# Altium footprint library OneBoxLib_OTHER.PcbLib: 64 footprints (part 2 of 4)
Each footprint in its own frame and in the unit in brackets; x right, y up, seen from the top. Pads: shape width x height; smd on the part's side, far side on the other; paste and mask are expansions set on the pad; w line width, h text height; cw(c..) or ccw(c..) is an arc to the next point about the centre after c.
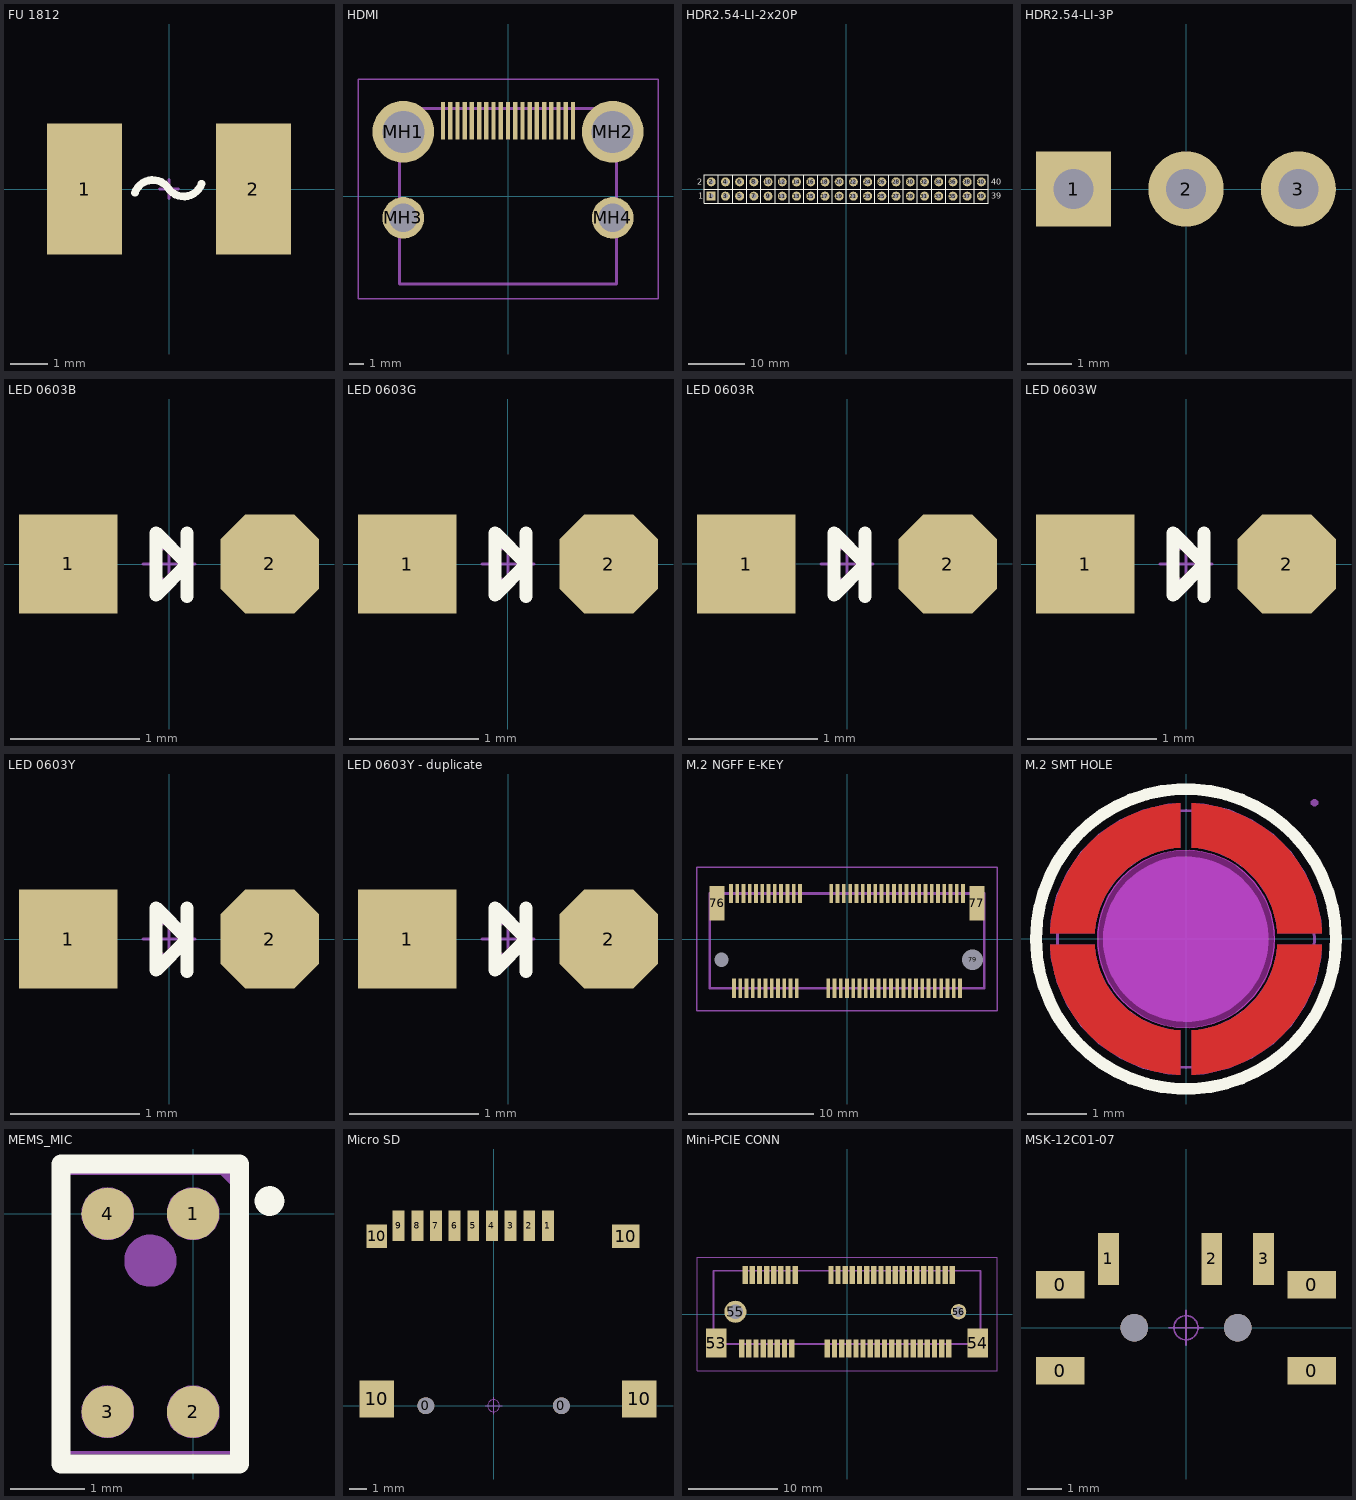
[diagram p1: the footprints below, top view; thin cyan lines are the x and y axes]

## FU 1812 [mm] "贴片保险丝"
pads (2):
  rect 2x3.5 smd: 1(-2.25,0) 2(2.25,0)
Top Overlay:
  lines w0.203: -0.908,-0.1 cw(c-0.434,-0.26) -0.02,0.02 ccw(c0.394,0.3) 0.868,0.14
Mechanical 15:
  lines w0.076: -0.254,0 0.254,0 ; 0,-0.254 0,0.254
3D body "FU 01812.STEP": height 0.87, standoff 0, extent -2.3,-1.61 2.3,1.61

## HDMI [mm]
pads (23):
  rect 0.3x2.6 smd: 1(4.5,5.235) 2(4,5.235) 3(3.5,5.235) 4(3,5.235) 5(2.5,5.235) 6(2,5.235) 7(1.5,5.235) 8(1,5.235) 9(0.5,5.235) 10(0,5.235) 11(-0.5,5.235) 12(-1,5.235) 13(-1.5,5.235) 14(-2,5.235) 15(-2.5,5.235) 16(-3,5.235) 17(-3.5,5.235) 18(-4,5.235) 19(-4.5,5.235)
  round 4.275 hole 2.909: MH1(-7.25,4.475) MH2(7.25,4.475)
  round 2.88 hole 1.992: MH3(-7.25,-1.485) MH4(7.25,-1.485)
Mechanical 13:
  lines w0.2: -7.5,-6.075 7.5,-6.075 7.5,6.075 -7.5,6.075 -7.5,-6.075
Mechanical 15:
  lines w0.1: -10.387,-7.075 10.387,-7.075 10.387,8.1 -10.387,8.1 -10.387,-7.075
3D body "208658-1051.stp": height 6.18, standoff -2.21, extent -7.499,-5.99 7.501,6.16

## HDR2.54-LI-2x20P [mm] "双排排针，20x2脚"
pads (40):
  rect 1.6x1.6 hole 0.9: 1(-24.13,-1.27)
  round 1.6 hole 0.9: 2(-24.13,1.27) 3(-21.59,-1.27) 4(-21.59,1.27) 5(-19.05,-1.27) 6(-19.05,1.27) 7(-16.51,-1.27) 8(-16.51,1.27) 9(-13.97,-1.27) 10(-13.97,1.27) 11(-11.43,-1.27) 12(-11.43,1.27) 13(-8.89,-1.27) 14(-8.89,1.27) 15(-6.35,-1.27) 16(-6.35,1.27) 17(-3.81,-1.27) 18(-3.81,1.27) 19(-1.27,-1.27) 20(-1.27,1.27) 21(1.27,-1.27) 22(1.27,1.27) 23(3.81,-1.27) 24(3.81,1.27) 25(6.35,-1.27) 26(6.35,1.27) 27(8.89,-1.27) 28(8.89,1.27) 29(11.43,-1.27) 30(11.43,1.27) 31(13.97,-1.27) 32(13.97,1.27) 33(16.51,-1.27) 34(16.51,1.27) 35(19.05,-1.27) 36(19.05,1.27) 37(21.59,-1.27) 38(21.59,1.27) 39(24.13,-1.27) 40(24.13,1.27)
Top Overlay:
  lines w0.2: 25.4,-2.54 -25.4,-2.54 -25.4,2.54 25.4,2.54
  lines w0.203: -25.4,0 25.4,0 ; -22.86,-2.54 -22.86,2.54 ; -20.32,-2.54 -20.32,2.54 ; -17.78,-2.54 -17.78,2.54 ; -15.24,-2.54 -15.24,2.54 ; -12.7,-2.54 -12.7,2.54 ; -10.16,-2.54 -10.16,2.54 ; -7.62,-2.54 -7.62,2.54 ; -5.08,-2.54 -5.08,2.54 ; -2.54,-2.54 -2.54,2.54 ; 0,-2.54 0,2.54 ; 2.54,-2.54 2.54,2.54 ; 5.08,-2.54 5.08,2.54 ; 7.62,-2.54 7.62,2.54 ; 10.16,-2.54 10.16,2.54 ; 12.7,-2.54 12.7,2.54 ; 15.24,-2.54 15.24,2.54 ; 17.78,-2.54 17.78,2.54 ; 20.32,-2.54 20.32,2.54 ; 22.86,-2.54 22.86,2.54 ; 25.4,-2.54 25.4,2.54
  text "39" at 25.908,-1.778 h1.02
  text "40" at 25.908,0.762 h1.02
  text "2" at -26.67,0.762 h1.02
  text "1" at -26.416,-1.778 h1.02
3D body "HDR2.54-1x2P.STEP": height 8.5, standoff -3, extent -15.24,-2.54 -12.7,2.54
3D body "HDR2.54-1x2P.STEP": height 8.5, standoff -3, extent -22.86,-2.54 -20.32,2.54
3D body "HDR2.54-1x2P.STEP": height 8.5, standoff -3, extent -25.4,-2.54 -22.86,2.54
3D body "HDR2.54-1x2P.STEP": height 8.5, standoff -3, extent -17.78,-2.54 -15.24,2.54
3D body "HDR2.54-1x2P.STEP": height 8.5, standoff -3, extent -20.32,-2.54 -17.78,2.54
3D body "HDR2.54-1x2P.STEP": height 8.5, standoff -3, extent -2.54,-2.54 0,2.54
3D body "HDR2.54-1x2P.STEP": height 8.5, standoff -3, extent -10.16,-2.54 -7.62,2.54
3D body "HDR2.54-1x2P.STEP": height 8.5, standoff -3, extent -12.7,-2.54 -10.16,2.54
3D body "HDR2.54-1x2P.STEP": height 8.5, standoff -3, extent -5.08,-2.54 -2.54,2.54
3D body "HDR2.54-1x2P.STEP": height 8.5, standoff -3, extent -7.62,-2.54 -5.08,2.54
3D body "HDR2.54-1x2P.STEP": height 8.5, standoff -3, extent 10.16,-2.54 12.7,2.54
3D body "HDR2.54-1x2P.STEP": height 8.5, standoff -3, extent 2.54,-2.54 5.08,2.54
3D body "HDR2.54-1x2P.STEP": height 8.5, standoff -3, extent 0,-2.54 2.54,2.54
3D body "HDR2.54-1x2P.STEP": height 8.5, standoff -3, extent 7.62,-2.54 10.16,2.54
3D body "HDR2.54-1x2P.STEP": height 8.5, standoff -3, extent 5.08,-2.54 7.62,2.54
3D body "HDR2.54-1x2P.STEP": height 8.5, standoff -3, extent 22.86,-2.54 25.4,2.54
3D body "HDR2.54-1x2P.STEP": height 8.5, standoff -3, extent 15.24,-2.54 17.78,2.54
3D body "HDR2.54-1x2P.STEP": height 8.5, standoff -3, extent 12.7,-2.54 15.24,2.54
3D body "HDR2.54-1x2P.STEP": height 8.5, standoff -3, extent 20.32,-2.54 22.86,2.54
3D body "HDR2.54-1x2P.STEP": height 8.5, standoff -3, extent 17.78,-2.54 20.32,2.54

## HDR2.54-LI-3P [mm] "排针，3脚"
pads (3):
  rect 1.7x1.7 hole 0.9: 1(-2.54,0)
  round 1.7 hole 0.9: 2(0,0) 3(2.54,0)
3D body "HDR2.54-1P.STEP": height 8.5, standoff -3, extent -3.81,-1.27 -1.27,1.27
3D body "HDR2.54-1P.STEP": height 8.5, standoff -3, extent -1.27,-1.27 1.27,1.27
3D body "HDR2.54-1P.STEP": height 8.5, standoff -3, extent 1.27,-1.27 3.81,1.27

## LED 0603B [mil] "蓝色0603LED"
pads (2):
  rect 30x30 smd: 1(-30.59,0)
  oct 30x30 smd: 2(30.59,0)
Top Overlay:
  lines w4: 5.51,-9.84 5.51,9.45 ; -3.94,-9.45 5.51,0 -3.94,9.45 -3.94,-9.45
Mechanical 15:
  circle w1: c0,0 r5
  lines w1: -7.87,0 7.87,0 ; 0,-7.87 0,7.88
3D body "LED 0603-B.STEP": height 18.36, standoff -0.16, extent -31.49,-15.78 31.5,15.79
3D body "LED 0603玻璃罩.STEP": height 23.82, standoff 8.07, extent -23.63,-15.75 23.62,15.75

## LED 0603G [mil] "绿色0603LED"
pads (2):
  rect 30x30 smd: 1(-30.59,0)
  oct 30x30 smd: 2(30.59,0)
Top Overlay:
  lines w4: 5.51,-9.84 5.51,9.45 ; -3.94,-9.45 -3.94,9.45 5.51,0 -3.94,-9.45
Mechanical 15:
  circle w1: c0,0 r5
  lines w1: -7.87,0 7.88,0 ; 0,-7.87 0,7.88
3D body "LED 0603玻璃罩.STEP": height 23.82, standoff 8.07, extent -23.62,-15.75 23.62,15.74
3D body "LED 0603-G.STEP": height 18.36, standoff -0.16, extent -31.49,-15.79 31.5,15.79

## LED 0603R [mil] "红色0603LED"
pads (2):
  rect 30x30 smd: 1(-30.59,0)
  oct 30x30 smd: 2(30.59,0)
Top Overlay:
  lines w4: 5.51,-9.85 5.51,9.44 ; -3.94,-9.45 -3.94,9.44 5.51,0 -3.94,-9.45
Mechanical 15:
  circle w1: c0,0 r5
  lines w1: -7.88,0 7.87,0 ; 0,-7.88 0,7.87
3D body "LED 0603玻璃罩.STEP": height 23.82, standoff 8.07, extent -23.63,-15.75 23.62,15.74
3D body "LED 0603-R.STEP": height 18.36, standoff -0.16, extent -31.49,-15.78 31.5,15.79

## LED 0603W [mil] "白色0603LED"
pads (2):
  rect 30x30 smd: 1(-30.59,0)
  oct 30x30 smd: 2(30.59,0)
Top Overlay:
  lines w4: 5.51,-9.84 5.51,9.45 ; -3.94,-9.45 -3.94,9.45 5.51,0 -3.94,-9.45
Mechanical 15:
  circle w1: c0,0 r5
  lines w1: -7.87,0 7.87,0 ; 0,-7.87 0,7.87
3D body "LED 0603-W.STEP": height 18.36, standoff -0.16, extent -31.49,-15.78 31.5,15.8
3D body "LED 0603玻璃罩.STEP": height 23.82, standoff 8.07, extent -23.62,-15.75 23.62,15.75

## LED 0603Y [mil] "黄色0603LED"
pads (2):
  rect 30x30 smd: 1(-30.59,0)
  oct 30x30 smd: 2(30.59,0)
Top Overlay:
  lines w4: 5.51,-9.84 5.51,9.45 ; -3.94,-9.45 -3.94,9.45 5.51,0 -3.94,-9.45
Mechanical 15:
  circle w1: c0,0 r5
  lines w1: -7.87,0 7.87,0 ; 0,-7.87 0,7.87
3D body "LED 0603玻璃罩.STEP": height 23.82, standoff 8.07, extent -23.63,-15.75 23.62,15.74
3D body "LED 0603-Y.STEP": height 18.36, standoff -0.16, extent -31.5,-16.04 31.5,15.54

## LED 0603Y - duplicate [mil] "黄色0603LED"
pads (2):
  rect 30x30 smd: 1(-30.59,0)
  oct 30x30 smd: 2(30.59,0)
Top Overlay:
  lines w4: 5.51,-9.84 5.51,9.45 ; -3.94,-9.45 -3.94,9.45 5.51,0 -3.94,-9.45
Mechanical 15:
  circle w1: c0,0 r5
  lines w1: -7.87,0 7.87,0 ; 0,-7.87 0,7.87
3D body "LED 0603-Y.STEP": height 18.36, standoff -0.16, extent -31.5,-16.04 31.5,15.54
3D body "LED 0603玻璃罩.STEP": height 23.82, standoff 8.07, extent -23.63,-15.75 23.62,15.74

## M.2 NGFF E-KEY [mm]
pads (71):
  rect 0.3x1.55 smd: 1(-9.25,3.625) 2(-9,-3.925) 3(-8.75,3.625) 4(-8.5,-3.925) 5(-8.25,3.625) 6(-8,-3.925) 7(-7.75,3.625) 8(-7.5,-3.925) 9(-7.25,3.625) 10(-7,-3.925) 11(-6.75,3.625) 12(-6.5,-3.925) 13(-6.25,3.625) 14(-6,-3.925) 15(-5.75,3.625) 16(-5.5,-3.925) 17(-5.25,3.625) 18(-5,-3.925) 19(-4.75,3.625) 20(-4.5,-3.925) 21(-4.25,3.625) 22(-4,-3.925) 23(-3.75,3.625) 32(-1.5,-3.925) 33(-1.25,3.625) 34(-1,-3.925) 35(-0.75,3.625) 36(-0.5,-3.925) 37(-0.25,3.625) 38(0,-3.925) 39(0.25,3.625) 40(0.5,-3.925) 41(0.75,3.625) 42(1,-3.925) 43(1.25,3.625) 44(1.5,-3.925) 45(1.75,3.625) 46(2,-3.925) 47(2.25,3.625) 48(2.5,-3.925) 49(2.75,3.625) 50(3,-3.925) 51(3.25,3.625) 52(3.5,-3.925) 53(3.75,3.625) 54(4,-3.925) 55(4.25,3.625) 56(4.5,-3.925) 57(4.75,3.625) 58(5,-3.925) 59(5.25,3.625) 60(5.5,-3.925) 61(5.75,3.625) 62(6,-3.925) 63(6.25,3.625) 64(6.5,-3.925) 65(6.75,3.625) 66(7,-3.925) 67(7.25,3.625) 68(7.5,-3.925) 69(7.75,3.625) 70(8,-3.925) 71(8.25,3.625) 72(8.5,-3.925) 73(8.75,3.625) 74(9,-3.925) 75(9.25,3.625)
  rect 1.2x2.75 smd: 76(-10.35,2.85) 77(10.35,2.85)
  round 0.575 hole 1.15 unplated: 78(-10,-1.65)
  round 0.825 hole 1.65 unplated: 79(10,-1.65)
Mechanical 13:
  lines w0.2: -10.95,-3.925 10.95,-3.925 10.95,3.625 -10.95,3.625 -10.95,-3.925
Mechanical 15:
  lines w0.1: -11.95,-5.7 -11.95,5.7 11.95,5.7 11.95,-5.7 -11.95,-5.7
3D body "2199230-4.stp": height 4.13, standoff -0.58, extent -10.95,-4.5 10.95,4.2

## M.2 SMT HOLE [mm]
Top Layer:
  region: 2.294,-0.099 1.544,-0.099 1.54,-0.157 1.533,-0.214 1.524,-0.27 1.513,-0.327 1.5,-0.383 1.485,-0.438 1.468,-0.493 1.448,-0.547 1.427,-0.6 1.404,-0.653 1.379,-0.705 1.352,-0.755 1.323,-0.805 1.292,-0.854 1.26,-0.901 1.226,-0.947 1.19,-0.992 1.152,-1.036 1.113,-1.078 1.073,-1.118 1.031,-1.158 0.987,-1.195 0.942,-1.231 0.896,-1.265 0.849,-1.298 0.8,-1.328 0.75,-1.357 0.7,-1.384 0.648,-1.409 0.595,-1.432 0.542,-1.453 0.488,-1.473 0.433,-1.49 0.378,-1.505 0.322,-1.518 0.265,-1.529 0.208,-1.538 0.151,-1.545 0.094,-1.549 0.094,-2.299 0.164,-2.295 0.233,-2.289 0.302,-2.281 0.371,-2.271 0.44,-2.258 0.508,-2.244 0.576,-2.227 0.643,-2.208 0.71,-2.188 0.776,-2.165 0.841,-2.141 0.905,-2.114 0.969,-2.085 1.032,-2.055 1.094,-2.023 1.154,-1.988 1.214,-1.952 1.273,-1.915 1.33,-1.875 1.386,-1.834 1.441,-1.791 1.495,-1.746 1.547,-1.7 1.598,-1.652 1.647,-1.603 1.695,-1.552 1.741,-1.5 1.786,-1.446 1.829,-1.391 1.87,-1.335 1.91,-1.278 1.947,-1.219 1.983,-1.159 2.018,-1.099 2.05,-1.037 2.08,-0.974 2.109,-0.911 2.135,-0.846 2.16,-0.781 2.183,-0.715 2.203,-0.648 2.222,-0.581 2.239,-0.513 2.253,-0.445 2.265,-0.377 2.276,-0.308 2.284,-0.238 2.29,-0.169
  region: -2.3,0.094 -1.55,0.094 -1.545,0.151 -1.538,0.208 -1.529,0.265 -1.518,0.321 -1.505,0.377 -1.49,0.432 -1.473,0.487 -1.454,0.542 -1.433,0.595 -1.41,0.647 -1.384,0.699 -1.357,0.75 -1.329,0.8 -1.298,0.848 -1.266,0.896 -1.231,0.942 -1.195,0.987 -1.158,1.03 -1.119,1.072 -1.078,1.113 -1.036,1.152 -0.993,1.189 -0.948,1.225 -0.902,1.259 -0.854,1.292 -0.806,1.323 -0.756,1.351 -0.705,1.378 -0.653,1.404 -0.601,1.427 -0.547,1.448 -0.493,1.467 -0.438,1.484 -0.383,1.499 -0.327,1.512 -0.271,1.523 -0.214,1.532 -0.157,1.539 -0.1,1.544 -0.1,2.294 -0.169,2.29 -0.239,2.284 -0.308,2.275 -0.377,2.265 -0.446,2.253 -0.514,2.238 -0.582,2.222 -0.649,2.203 -0.715,2.182 -0.781,2.16 -0.847,2.135 -0.911,2.108 -0.975,2.08 -1.037,2.049 -1.099,2.017 -1.16,1.983 -1.22,1.947 -1.278,1.909 -1.336,1.87 -1.392,1.828 -1.447,1.785 -1.5,1.741 -1.552,1.694 -1.603,1.647 -1.653,1.597 -1.7,1.546 -1.747,1.494 -1.791,1.441 -1.834,1.386 -1.875,1.33 -1.915,1.272 -1.953,1.214 -1.989,1.154 -2.023,1.093 -2.055,1.031 -2.086,0.969 -2.114,0.905 -2.141,0.841 -2.166,0.775 -2.188,0.709 -2.209,0.643 -2.227,0.576 -2.244,0.508 -2.259,0.44 -2.271,0.371 -2.281,0.302 -2.29,0.233 -2.296,0.163
  region: -0.099,-2.3 -0.099,-1.55 -0.157,-1.545 -0.214,-1.538 -0.27,-1.529 -0.327,-1.518 -0.383,-1.505 -0.438,-1.49 -0.493,-1.473 -0.547,-1.454 -0.601,-1.433 -0.653,-1.41 -0.705,-1.384 -0.755,-1.357 -0.805,-1.329 -0.854,-1.298 -0.901,-1.266 -0.947,-1.231 -0.992,-1.195 -1.036,-1.158 -1.078,-1.119 -1.118,-1.078 -1.158,-1.036 -1.195,-0.993 -1.231,-0.948 -1.265,-0.902 -1.298,-0.854 -1.328,-0.806 -1.357,-0.756 -1.384,-0.705 -1.409,-0.653 -1.432,-0.601 -1.453,-0.548 -1.473,-0.493 -1.49,-0.439 -1.505,-0.383 -1.518,-0.327 -1.529,-0.271 -1.538,-0.214 -1.545,-0.157 -1.549,-0.1 -2.299,-0.1 -2.295,-0.169 -2.289,-0.239 -2.281,-0.308 -2.271,-0.377 -2.258,-0.446 -2.244,-0.514 -2.227,-0.582 -2.209,-0.649 -2.188,-0.715 -2.165,-0.781 -2.141,-0.847 -2.114,-0.911 -2.086,-0.975 -2.055,-1.037 -2.023,-1.099 -1.989,-1.16 -1.953,-1.22 -1.915,-1.278 -1.875,-1.336 -1.834,-1.392 -1.791,-1.447 -1.746,-1.5 -1.7,-1.553 -1.652,-1.603 -1.603,-1.653 -1.552,-1.7 -1.5,-1.747 -1.446,-1.791 -1.391,-1.834 -1.335,-1.876 -1.278,-1.915 -1.219,-1.953 -1.16,-1.989 -1.099,-2.023 -1.037,-2.055 -0.974,-2.086 -0.911,-2.114 -0.846,-2.141 -0.781,-2.166 -0.715,-2.188 -0.648,-2.209 -0.581,-2.228 -0.513,-2.244 -0.445,-2.259 -0.377,-2.271 -0.308,-2.281 -0.238,-2.29 -0.169,-2.296
  region: 0.094,2.294 0.094,1.544 0.151,1.539 0.208,1.533 0.265,1.524 0.321,1.513 0.377,1.5 0.432,1.485 0.487,1.467 0.541,1.448 0.595,1.427 0.647,1.404 0.699,1.379 0.75,1.352 0.8,1.323 0.848,1.292 0.896,1.26 0.942,1.226 0.987,1.19 1.03,1.152 1.072,1.113 1.113,1.073 1.152,1.031 1.189,0.987 1.225,0.942 1.259,0.896 1.292,0.849 1.323,0.8 1.351,0.75 1.378,0.7 1.403,0.648 1.427,0.595 1.448,0.542 1.467,0.488 1.484,0.433 1.499,0.378 1.512,0.322 1.523,0.265 1.532,0.208 1.539,0.151 1.544,0.094 2.294,0.094 2.29,0.164 2.283,0.233 2.275,0.302 2.265,0.371 2.252,0.44 2.238,0.508 2.221,0.576 2.203,0.643 2.182,0.71 2.16,0.776 2.135,0.841 2.108,0.905 2.08,0.969 2.049,1.032 2.017,1.094 1.983,1.154 1.947,1.214 1.909,1.273 1.869,1.33 1.828,1.386 1.785,1.441 1.741,1.495 1.694,1.547 1.647,1.598 1.597,1.647 1.546,1.695 1.494,1.741 1.441,1.786 1.386,1.829 1.33,1.87 1.272,1.91 1.214,1.947 1.154,1.983 1.093,2.018 1.031,2.05 0.969,2.08 0.905,2.109 0.84,2.135 0.775,2.16 0.709,2.183 0.643,2.203 0.575,2.222 0.508,2.239 0.44,2.253 0.371,2.265 0.302,2.276 0.233,2.284 0.163,2.29
Top Overlay:
  circle w0.2: c-0.003,-0.003 r2.537
Keep-Out Layer:
  board cut-out: 1.497,-0.003 1.497,0.145 1.44,0.435 1.326,0.708 1.162,0.953 0.953,1.162 0.708,1.326 0.435,1.44 0.145,1.497 -0.151,1.497 -0.44,1.44 -0.713,1.326 -0.959,1.162 -1.168,0.953 -1.332,0.708 -1.445,0.435 -1.503,0.145 -1.503,-0.003 -1.503,-0.151 -1.445,-0.44 -1.332,-0.713 -1.168,-0.959 -0.959,-1.168 -0.713,-1.332 -0.44,-1.445 -0.151,-1.503 0.145,-1.503 0.435,-1.445 0.708,-1.332 0.953,-1.168 1.162,-0.959 1.326,-0.713 1.44,-0.44 1.497,-0.151
Mechanical 1:
  circle w0.005: c-0.003,-0.003 r1.5
Mechanical 6:
  circle w1.4: c-0.007,-0.006 r0.7
Mechanical 15:
  region: 2.294,-0.099 1.544,-0.099 1.529,-0.238 1.462,-0.51 1.347,-0.765 1.188,-0.995 0.99,-1.193 0.76,-1.352 0.505,-1.467 0.233,-1.534 0.094,-1.549 0.094,-2.299 0.308,-2.29 0.725,-2.193 1.118,-2.021 1.471,-1.779 1.774,-1.476 2.016,-1.122 2.188,-0.73 2.285,-0.313
  region: -0.099,-2.3 -0.099,-1.55 -0.238,-1.535 -0.51,-1.467 -0.765,-1.352 -0.995,-1.193 -1.193,-0.995 -1.352,-0.765 -1.467,-0.51 -1.534,-0.239 -1.549,-0.1 -2.299,-0.1 -2.29,-0.314 -2.193,-0.731 -2.021,-1.123 -1.779,-1.477 -1.476,-1.78 -1.123,-2.021 -0.73,-2.194 -0.313,-2.291
  region: -2.3,0.094 -1.55,0.094 -1.535,0.233 -1.467,0.504 -1.352,0.759 -1.193,0.989 -0.995,1.187 -0.765,1.346 -0.51,1.461 -0.239,1.528 -0.1,1.544 -0.1,2.294 -0.314,2.284 -0.731,2.187 -1.123,2.015 -1.477,1.773 -1.78,1.471 -2.021,1.117 -2.194,0.725 -2.291,0.308
  region: 0.093,2.294 0.093,1.544 0.233,1.529 0.504,1.462 0.759,1.347 0.989,1.188 1.187,0.99 1.346,0.76 1.461,0.505 1.528,0.233 1.543,0.094 2.293,0.094 2.284,0.308 2.187,0.725 2.015,1.118 1.773,1.471 1.47,1.774 1.117,2.016 0.725,2.188 0.307,2.285
  region: 2.231,2.303 2.231,2.328 2.196,2.363 2.146,2.363 2.111,2.328 2.111,2.303 2.111,2.278 2.146,2.243 2.196,2.243 2.231,2.278
  lines w0.051: -0.002,-2.18 ccw(c-0.002,-0.006) 2.171,-0.006 2.171,-0.003 ccw(c-0.003,-0.003) -0.003,2.171 -0.003,2.172 ccw(c-0.003,-0.004) -2.179,-0.004 ccw(c-0.003,-0.004) -0.003,-2.18 ; -0.003,-2.18 -0.002,-2.18

## MEMS_MIC [mm]
pads (4):
  round 0.701 smd mask+0.051: 1(0,0) 2(0,-2.662) 3(-1.148,-2.662) 4(-1.148,0)
Top Overlay:
  circle w0.201: c1.026,0.17 r0.099
  lines w0.254: 0.625,-3.363 -1.773,-3.363 -1.773,0.668 0.625,0.668 0.625,-3.33
Mechanical 6:
  circle w0.351: c-0.574,-0.63 r0.175
  region: 0.546,0.549 0.345,0.549 0.546,0.348
Mechanical 15:
  region: -0.798,-2.662 -0.798,-2.592 -0.851,-2.463 -0.95,-2.365 -1.078,-2.311 -1.218,-2.311 -1.347,-2.365 -1.445,-2.463 -1.499,-2.592 -1.499,-2.662 -1.499,-2.732 -1.445,-2.86 -1.347,-2.959 -1.218,-3.012 -1.078,-3.012 -0.95,-2.959 -0.851,-2.86 -0.798,-2.732
  region: 0.351,-2.662 0.351,-2.592 0.297,-2.463 0.199,-2.365 0.07,-2.311 -0.07,-2.311 -0.199,-2.365 -0.297,-2.463 -0.351,-2.592 -0.351,-2.662 -0.351,-2.732 -0.297,-2.86 -0.199,-2.959 -0.07,-3.012 0.07,-3.012 0.199,-2.959 0.297,-2.86 0.351,-2.732
  region: 0.351,0 0.351,0.07 0.297,0.199 0.199,0.297 0.07,0.351 -0.07,0.351 -0.199,0.297 -0.297,0.199 -0.351,0.07 -0.351,0 -0.351,-0.07 -0.297,-0.199 -0.199,-0.297 -0.07,-0.351 0.07,-0.351 0.199,-0.297 0.297,-0.199 0.351,-0.07
  region: -0.798,0 -0.798,0.07 -0.851,0.199 -0.95,0.297 -1.078,0.351 -1.218,0.351 -1.347,0.297 -1.445,0.199 -1.499,0.07 -1.499,0 -1.499,-0.07 -1.445,-0.199 -1.347,-0.297 -1.218,-0.351 -1.078,-0.351 -0.95,-0.297 -0.851,-0.199 -0.798,-0.07
  region: 0.607,0.549 0.607,0.574 0.571,0.61 0.521,0.61 0.485,0.574 0.485,0.549 0.485,0.523 0.521,0.488 0.571,0.488 0.607,0.523
  lines w0.051: -1.694,-3.211 0.546,-3.211 0.546,0.549 -1.694,0.549 -1.694,-3.211

## Micro SD [mm]
pads (15):
  round 1 hole 1 unplated: 0(-4,0) 0(4,0)
  rect 0.7x1.8 smd: 1(3.2,10.627) 2(2.1,10.627) 3(1,10.627) 4(-0.1,10.627) 5(-1.2,10.627) 6(-2.3,10.627) 7(-3.4,10.627) 8(-4.5,10.627) 9(-5.6,10.627)
  rect 2.032x2.2 smd: 10(-6.9,0.4) 10(8.6,0.4)
  rect 1.2x1.4 smd: 10(-6.9,10)
  rect 1.6x1.4 smd: 10(7.8,10)
Mechanical 15:
  circle w0.05: c0,0 r0.35
  lines w0.05: -0.5,0 0.5,0 ; 0,-0.5 0,0.5
3D body "TF 卡?": height 2, standoff -0.45, extent -7.05,-4 8.95,11.25

## Mini-PCIE CONN [mm]
pads (56):
  rect 0.6x2 smd: 1(-11.8,-3.85) 2(-11.4,4.35) 3(-11,-3.85) 4(-10.6,4.35) 5(-10.2,-3.85) 6(-9.8,4.35) 7(-9.4,-3.85) 8(-9,4.35) 9(-8.6,-3.85) 10(-8.2,4.35) 11(-7.8,-3.85) 12(-7.4,4.35) 13(-7,-3.85) 14(-6.6,4.35) 15(-6.2,-3.85) 16(-5.8,4.35) 17(-2.2,-3.85) 18(-1.8,4.35) 19(-1.4,-3.85) 20(-1,4.35) 21(-0.6,-3.85) 22(-0.2,4.35) 23(0.2,-3.85) 24(0.6,4.35) 25(1,-3.85) 26(1.4,4.35) 27(1.8,-3.85) 28(2.2,4.35) 29(2.6,-3.85) 30(3,4.35) 31(3.4,-3.85) 32(3.8,4.35) 33(4.2,-3.85) 34(4.6,4.35) 35(5,-3.85) 36(5.4,4.35) 37(5.8,-3.85) 38(6.2,4.35) 39(6.6,-3.85) 40(7,4.35) 41(7.4,-3.85) 42(7.8,4.35) 43(8.2,-3.85) 44(8.6,4.35) 45(9,-3.85) 46(9.4,4.35) 47(9.8,-3.85) 48(10.2,4.35) 49(10.6,-3.85) 50(11,4.35) 51(11.4,-3.85) 52(11.8,4.35)
  rect 2.3x3.2 smd: 53(-14.65,-3.25) 54(14.65,-3.25)
  round 2.475 hole 1.65: 55(-12.5,0.25)
  round 1.725 hole 1.15: 56(12.5,0.25)
Mechanical 13:
  lines w0.2: -14.95,-3.35 -14.95,4.85 14.95,4.85 14.95,-3.35 -14.95,-3.35
Mechanical 15:
  lines w0.1: -16.8,-6.35 -16.8,6.35 16.8,6.35 16.8,-6.35 -16.8,-6.35
3D body "1775838-2.stp": height 5.68, standoff -0.58, extent -14.95,-4.54 14.95,4.54

## MSK-12C01-07 [mm] "6.7*2.8*1.5mm(长宽高）"
pads (9):
  rect 1.4x0.8 smd: 0(-3.65,-1.25) 0(-3.65,1.25) 0(3.65,-1.25) 0(3.65,1.25)
  rect 0.6x1.5 smd: 1(-2.25,1.996) 2(0.75,1.996) 3(2.25,1.996)
  round 0.8 hole 0.8: " "(-1.5,0) " "(1.5,0)
Mechanical 15:
  circle w0.05: c0,0 r0.35
  lines w0.05: -0.5,0 0.5,0 ; 0,-0.5 0,0.5
3D body "MSK-12C01-07.STEP": height 1.5, standoff -0.5, extent -3.92,-2.9 3.92,2.4